# Altium footprint library LukaLIBRARY.PcbLib: 772 footprints (part 24 of 49)
Each footprint in its own frame and in the unit in brackets; x right, y up, seen from the top. Pads: shape width x height; smd on the part's side, far side on the other; paste and mask are expansions set on the pad; w line width, h text height; cw(c..) or ccw(c..) is an arc to the next point about the centre after c.
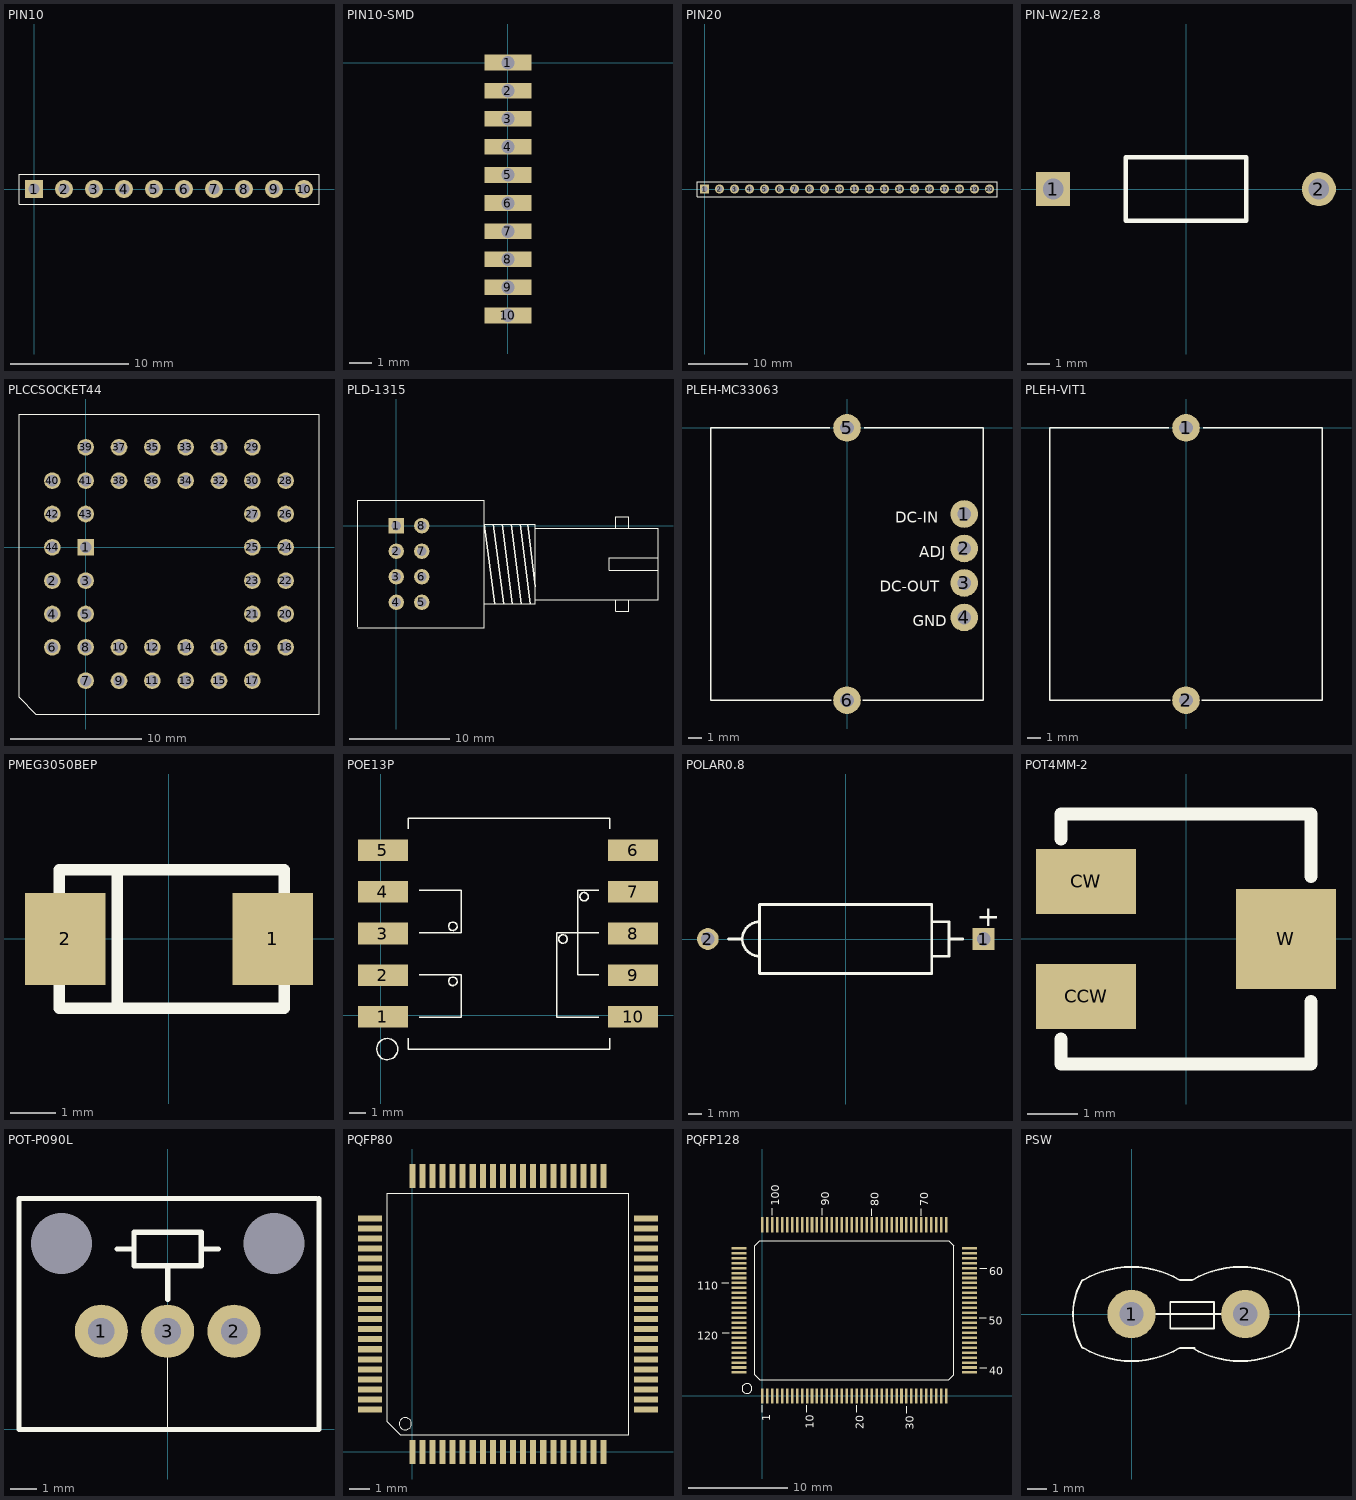
[diagram p23: the footprints below, top view; thin cyan lines are the x and y axes]

## PIN10 [mil]
pads (10):
  rect 60x60 hole 38 mask-1000: 1(0,0)
  round 60 hole 38 mask-1000: 2(100,0) 3(200,0) 4(300,0) 5(400,0) 6(500,0) 7(600,0) 8(700,0) 9(800,0) 10(900,0)
Top Overlay:
  lines w1: -50,-50 950,-50 950,50 -50,50 -50,-50
Top Solder:
  drawing of 10 lines, arcs and shapes, not listed
Bottom Solder:
  drawing of 10 lines, arcs and shapes, not listed

## PIN10-SMD [mm]
pads (10):
  rect 2.1x0.7 hole 0.6 unplated: 1(0,0) 2(0,-1.25) 3(0,-2.5) 4(0,-3.75) 5(0,-5) 6(0,-6.25) 7(0,-7.5) 8(0,-8.75) 9(0,-10) 10(0,-11.25)
Bottom Paste:
  region: -1.05,-6.6 1.05,-6.6 1.05,-5.9 -1.05,-5.9
  region: -1.05,-7.85 1.05,-7.85 1.05,-7.15 -1.05,-7.15
  region: -1.05,-9.1 1.05,-9.1 1.05,-8.4 -1.05,-8.4
  region: -1.05,-10.35 1.05,-10.35 1.05,-9.65 -1.05,-9.65
  region: -1.05,-11.6 1.05,-11.6 1.05,-10.9 -1.05,-10.9
  region: -1.05,-0.35 1.05,-0.35 1.05,0.35 -1.05,0.35
  region: -1.05,-1.6 1.05,-1.6 1.05,-0.9 -1.05,-0.9
  region: -1.05,-4.1 1.05,-4.1 1.05,-3.4 -1.05,-3.4
  region: -1.05,-2.85 1.05,-2.85 1.05,-2.15 -1.05,-2.15
  region: -1.05,-5.35 1.05,-5.35 1.05,-4.65 -1.05,-4.65
Top Solder:
  region: -1.05,-6.6 1.05,-6.6 1.05,-5.9 -1.05,-5.9
  region: -1.05,-7.85 1.05,-7.85 1.05,-7.15 -1.05,-7.15
  region: -1.05,-9.1 1.05,-9.1 1.05,-8.4 -1.05,-8.4
  region: -1.05,-10.35 1.05,-10.35 1.05,-9.65 -1.05,-9.65
  region: -1.05,-11.6 1.05,-11.6 1.05,-10.9 -1.05,-10.9
  region: -1.05,-0.35 1.05,-0.35 1.05,0.35 -1.05,0.35
  region: -1.05,-1.6 1.05,-1.6 1.05,-0.9 -1.05,-0.9
  region: -1.05,-4.1 1.05,-4.1 1.05,-3.4 -1.05,-3.4
  region: -1.05,-2.85 1.05,-2.85 1.05,-2.15 -1.05,-2.15
  region: -1.05,-5.35 1.05,-5.35 1.05,-4.65 -1.05,-4.65

## PIN20 [mil]
pads (20):
  rect 60x60 hole 38 mask-1000: 1(0,0)
  round 60 hole 38 mask-1000: 2(100,0) 3(200,0) 4(300,0) 5(400,0) 6(500,0) 7(600,0) 8(700,0) 9(800,0) 10(900,0) 11(1000,0) 12(1100,0) 13(1200,0) 14(1300,0) 15(1400,0) 16(1500,0) 17(1600,0) 18(1700,0) 19(1800,0) 20(1900,0)
Top Overlay:
  lines w1: -50,-50 950,-50 1950,-50 1950,50 950,50 -50,50 -50,-50
Top Solder:
  drawing of 20 lines, arcs and shapes, not listed
Bottom Solder:
  drawing of 20 lines, arcs and shapes, not listed

## PIN-W2/E2.8 [mm] "Thru-Hole; 2 Leads"
pads (2):
  rect 1.5x1.5 hole 0.9: 1(-5.825,0)
  round 1.5 hole 0.9: 2(5.825,0)
Top Overlay:
  lines w0.2: -2.65,-1.4 -2.65,1.4 2.65,1.4 2.65,-1.4 -2.65,-1.4

## PLCCSOCKET44 [mil]
pads (44):
  rect 50x50 hole 34 mask-1000: 1(0,0)
  round 50 hole 34 mask-1000: 2(-100,-100) 3(0,-100) 4(-100,-200) 5(0,-200) 6(-100,-300) 7(0,-400) 8(0,-300) 9(100,-400) 10(100,-300) 11(200,-400) 12(200,-300) 13(300,-400) 14(300,-300) 15(400,-400) 16(400,-300) 17(500,-400) 18(600,-300) 19(500,-300) 20(600,-200) 21(500,-200) 22(600,-100) 23(500,-100) 24(600,0) 25(500,0) 26(600,100) 27(500,100) 28(600,200) 29(500,300) 30(500,200) 31(400,300) 32(400,200) 33(300,300) 34(300,200) 35(200,300) 36(200,200) 37(100,300) 38(100,200) 39(0,300) 40(-100,200) 41(0,200) 42(-100,100) 43(0,100) 44(-100,0)
Top Overlay:
  lines w1: -200,-450 -150,-500 700,-500 700,400 -200,400 -200,-450
Top Solder:
  drawing of 44 lines, arcs and shapes, not listed
Bottom Solder:
  drawing of 44 lines, arcs and shapes, not listed

## PLD-1315 [mil]
pads (8):
  rect 60x60 hole 38: 1(0,0)
  round 60 hole 38: 2(0,-100) 3(0,-200) 4(0,-300) 5(100,-300) 6(100,-200) 7(100,-100) 8(100,0)
Top Overlay:
  lines w1: -150,-400 345,-400 345,100 -150,100 -150,-395 ; 345,-305 545,-305 545,5 345,5 ; 545,-290 1025,-290 1025,-10 545,-10 ; 860,-290 860,-335 910,-335 910,-290 ; 860,-10 860,35 910,35 910,-10 ; 1025,-175 835,-175 835,-125 1025,-125
  lines w5: 345,5 385,-305 ; 380,5 420,-305 ; 415,5 455,-305 ; 450,5 490,-305 ; 485,5 525,-305 ; 515,5 545,-240

## PLEH-MC33063 [mil]
pads (6):
  round 80 hole 40: 1(340,-250) 2(340,-350) 3(340,-450) 4(340,-550) 5(0,0) 6(0,-790)
Top Overlay:
  lines w3.94: -50,0 -395,0 -395,-790 -45,-790 ; 45,-790 395,-790 395,0 50,0
  text "ADJ" at 210,-375 h31.25
  text "DC-IN" at 140,-275 h31.25
  text "GND" at 190,-575 h31.25
  text "DC-OUT" at 95,-475 h31.25

## PLEH-VIT1 [mil]
pads (2):
  round 80 hole 40: 1(0,0) 2(0,-790)
Top Overlay:
  lines w3.94: -50,0 -395,0 -395,-790 -45,-790 ; 45,-790 395,-790 395,0 50,0

## PMEG3050BEP [mil] "Diode Schotky"
pads (2):
  rect 70x80 smd: 1(90,0) 2(-90,0)
Top Overlay:
  lines w10: -45,-55 -45,60 ; -95,-60 100,-60 100,60 -95,60 -95,-60

## POE13P [mm]
pads (10):
  rect 3x1.3 smd mask-25.4: 1(0.126,-0.102) 2(0.126,2.398) 3(0.126,4.898) 4(0.126,7.398) 5(0.126,9.898) 6(15.126,9.898) 7(15.126,7.398) 8(15.126,4.898) 9(15.126,2.398) 10(15.126,-0.102)
Top Overlay:
  circle w0.076: c4.318,5.334 r0.254
  circle w0.076: c12.192,7.112 r0.254
  circle w0.076: c10.922,4.572 r0.254
  circle w0.076: c4.318,2.032 r0.254
  circle w0.076: c0.381,-2.032 r0.635
  lines w0.076: 1.651,-1.397 1.651,-2.032 13.716,-2.032 13.716,-1.397 ; 1.651,11.176 1.651,11.811 13.716,11.811 13.716,11.176 ; 2.286,-0.127 4.826,-0.127 4.826,2.413 2.286,2.413 ; 2.286,4.953 4.826,4.953 4.826,7.493 2.286,7.493 ; 13.081,-0.127 10.541,-0.127 10.541,4.953 13.081,4.953 ; 13.081,2.413 11.811,2.413 11.811,7.493 13.081,7.493
Top Solder:
  region: -1.374,-0.752 1.626,-0.752 1.626,0.548 -1.374,0.548
  region: 13.626,-0.752 16.626,-0.752 16.626,0.548 13.626,0.548
  region: -1.374,4.248 1.626,4.248 1.626,5.548 -1.374,5.548
  region: -1.374,6.748 1.626,6.748 1.626,8.048 -1.374,8.048
  region: 13.626,6.748 16.626,6.748 16.626,8.048 13.626,8.048
  region: 13.626,4.248 16.626,4.248 16.626,5.548 13.626,5.548
  region: -1.374,1.748 1.626,1.748 1.626,3.048 -1.374,3.048
  region: 13.626,9.248 16.626,9.248 16.626,10.548 13.626,10.548
  region: 13.626,1.748 16.626,1.748 16.626,3.048 13.626,3.048
  region: -1.374,9.248 1.626,9.248 1.626,10.548 -1.374,10.548

## POLAR0.8 [mm] "Polarized Capacitor; 2 Leads"
height 5.08
pads (2):
  rect 1.6x1.6 hole 1: 1(10.16,0)
  round 1.6 hole 1: 2(-10.16,0)
Top Overlay:
  lines w0.2: -8.636,0 -7.62,0 ; -6.35,-1.27 cw(c-6.35,0) -6.35,1.27 ; 6.35,-1.27 7.62,-1.27 7.62,1.27 6.35,1.27 ; 7.62,0 8.636,0 ; -6.35,-2.54 -6.35,2.54 6.35,2.54 6.35,-2.54 -6.35,-2.54
  text "+" at 9.652,0.95 h1.5

## POT4MM-2 [mm] "Square Trimming Potentiometer"
pads (3):
  rect 2x1.3 smd: CCW(-2,-1.15) CW(-2,1.15)
  rect 2x2 smd: W(2,0)
Top Overlay:
  lines w0.254: -2.5,-2 -2.5,-2.5 2.5,-2.5 2.5,-1.25 ; -2.5,2 -2.5,2.5 2.5,2.5 2.5,1.25

## POT-P090L [mm]
pads (5):
  round 2 hole 1 mask-25.4: 1(-2.5,3.7) 2(2.5,3.7) 3(0,3.7)
  round 0 hole 2.3 mask-25.4: 4(-4,7) 5(4,7)
Top Overlay:
  lines w0.01: 0,0 0,3.7
  lines w0.2: -1.905,6.8 -1.27,6.8 ; 0,4.895 0,6.165 ; 1.27,6.8 1.905,6.8 ; 5.6,8.7 -5.6,8.7 -5.6,0 5.7,0 5.7,8.7 ; -1.27,6.165 -1.27,7.435 1.27,7.435 1.27,6.165 -1.27,6.165
Top Solder:
  region: -2.5,4.709 -2.761,4.674 -3.004,4.573 -3.213,4.413 -3.373,4.204 -3.474,3.961 -3.509,3.7 -3.474,3.439 -3.373,3.196 -3.213,2.987 -3.004,2.827 -2.761,2.726 -2.5,2.691 -2.239,2.726 -1.996,2.827 -1.787,2.987 -1.627,3.196 -1.526,3.439 -1.491,3.7 -1.526,3.961 -1.627,4.204 -1.787,4.413 -1.996,4.573 -2.239,4.674
  region: -4,8.507 -4.294,8.478 -4.577,8.393 -4.837,8.253 -5.066,8.066 -5.253,7.837 -5.393,7.577 -5.478,7.294 -5.507,7 -5.478,6.706 -5.393,6.423 -5.253,6.163 -5.066,5.934 -4.837,5.747 -4.577,5.607 -4.294,5.522 -4,5.493 -3.706,5.522 -3.423,5.607 -3.163,5.747 -2.934,5.934 -2.747,6.163 -2.607,6.423 -2.522,6.706 -2.493,7 -2.522,7.294 -2.607,7.577 -2.747,7.837 -2.934,8.066 -3.163,8.253 -3.423,8.393 -3.706,8.478
  region: 2.5,4.709 2.239,4.674 1.996,4.573 1.787,4.413 1.627,4.204 1.526,3.961 1.491,3.7 1.526,3.439 1.627,3.196 1.787,2.987 1.996,2.827 2.239,2.726 2.5,2.691 2.761,2.726 3.004,2.827 3.213,2.987 3.373,3.196 3.474,3.439 3.509,3.7 3.474,3.961 3.373,4.204 3.213,4.413 3.004,4.573 2.761,4.674
  region: 4,8.507 3.706,8.478 3.423,8.393 3.163,8.253 2.934,8.066 2.747,7.837 2.607,7.577 2.522,7.294 2.493,7 2.522,6.706 2.607,6.423 2.747,6.163 2.934,5.934 3.163,5.747 3.423,5.607 3.706,5.522 4,5.493 4.294,5.522 4.577,5.607 4.837,5.747 5.066,5.934 5.253,6.163 5.393,6.423 5.478,6.706 5.507,7 5.478,7.294 5.393,7.577 5.253,7.837 5.066,8.066 4.837,8.253 4.577,8.393 4.294,8.478
  region: 0,4.709 -0.261,4.674 -0.504,4.573 -0.713,4.413 -0.873,4.204 -0.974,3.961 -1.009,3.7 -0.974,3.439 -0.873,3.196 -0.713,2.987 -0.504,2.827 -0.261,2.726 0,2.691 0.261,2.726 0.504,2.827 0.713,2.987 0.873,3.196 0.974,3.439 1.009,3.7 0.974,3.961 0.873,4.204 0.713,4.413 0.504,4.573 0.261,4.674
Bottom Solder:
  region: -2.5,4.709 -2.761,4.674 -3.004,4.573 -3.213,4.413 -3.373,4.204 -3.474,3.961 -3.509,3.7 -3.474,3.439 -3.373,3.196 -3.213,2.987 -3.004,2.827 -2.761,2.726 -2.5,2.691 -2.239,2.726 -1.996,2.827 -1.787,2.987 -1.627,3.196 -1.526,3.439 -1.491,3.7 -1.526,3.961 -1.627,4.204 -1.787,4.413 -1.996,4.573 -2.239,4.674
  region: -4,8.507 -4.294,8.478 -4.577,8.393 -4.837,8.253 -5.066,8.066 -5.253,7.837 -5.393,7.577 -5.478,7.294 -5.507,7 -5.478,6.706 -5.393,6.423 -5.253,6.163 -5.066,5.934 -4.837,5.747 -4.577,5.607 -4.294,5.522 -4,5.493 -3.706,5.522 -3.423,5.607 -3.163,5.747 -2.934,5.934 -2.747,6.163 -2.607,6.423 -2.522,6.706 -2.493,7 -2.522,7.294 -2.607,7.577 -2.747,7.837 -2.934,8.066 -3.163,8.253 -3.423,8.393 -3.706,8.478
  region: 2.5,4.709 2.239,4.674 1.996,4.573 1.787,4.413 1.627,4.204 1.526,3.961 1.491,3.7 1.526,3.439 1.627,3.196 1.787,2.987 1.996,2.827 2.239,2.726 2.5,2.691 2.761,2.726 3.004,2.827 3.213,2.987 3.373,3.196 3.474,3.439 3.509,3.7 3.474,3.961 3.373,4.204 3.213,4.413 3.004,4.573 2.761,4.674
  region: 4,8.507 3.706,8.478 3.423,8.393 3.163,8.253 2.934,8.066 2.747,7.837 2.607,7.577 2.522,7.294 2.493,7 2.522,6.706 2.607,6.423 2.747,6.163 2.934,5.934 3.163,5.747 3.423,5.607 3.706,5.522 4,5.493 4.294,5.522 4.577,5.607 4.837,5.747 5.066,5.934 5.253,6.163 5.393,6.423 5.478,6.706 5.507,7 5.478,7.294 5.393,7.577 5.253,7.837 5.066,8.066 4.837,8.253 4.577,8.393 4.294,8.478
  region: 0,4.709 -0.261,4.674 -0.504,4.573 -0.713,4.413 -0.873,4.204 -0.974,3.961 -1.009,3.7 -0.974,3.439 -0.873,3.196 -0.713,2.987 -0.504,2.827 -0.261,2.726 0,2.691 0.261,2.726 0.504,2.827 0.713,2.987 0.873,3.196 0.974,3.439 1.009,3.7 0.974,3.961 0.873,4.204 0.713,4.413 0.504,4.573 0.261,4.674

## PQFP80 [mm]
pads (80):
  rect 0.3x1.2 smd: 1(0,0) 2(0.5,0) 3(1,0) 4(1.5,0) 5(2,0) 6(2.5,0) 7(3,0) 8(3.5,0) 9(4,0) 10(4.5,0) 11(5,0) 12(5.5,0) 13(6,0) 14(6.5,0) 15(7,0) 16(7.5,0) 17(8,0) 18(8.5,0) 19(9,0) 20(9.5,0) 41(9.5,13.7) 42(9,13.7) 43(8.5,13.7) 44(8,13.7) 45(7.5,13.7) 46(7,13.7) 47(6.5,13.7) 48(6,13.7) 49(5.5,13.7) 50(5,13.7) 51(4.5,13.7) 52(4,13.7) 53(3.5,13.7) 54(3,13.7) 55(2.5,13.7) 56(2,13.7) 57(1.5,13.7) 58(1,13.7) 59(0.5,13.7) 60(0,13.7)
  rect 1.2x0.3 smd: 21(11.6,2.1) 22(11.6,2.6) 23(11.6,3.1) 24(11.6,3.6) 25(11.6,4.1) 26(11.6,4.6) 27(11.6,5.1) 28(11.6,5.6) 29(11.6,6.1) 30(11.6,6.6) 31(11.6,7.1) 32(11.6,7.6) 33(11.6,8.1) 34(11.6,8.6) 35(11.6,9.1) 36(11.6,9.6) 37(11.6,10.1) 38(11.6,10.6) 39(11.6,11.1) 40(11.6,11.6) 61(-2.1,11.6) 62(-2.1,11.1) 63(-2.1,10.6) 64(-2.1,10.1) 65(-2.1,9.6) 66(-2.1,9.1) 67(-2.1,8.6) 68(-2.1,8.1) 69(-2.1,7.6) 70(-2.1,7.1) 71(-2.1,6.6) 72(-2.1,6.1) 73(-2.1,5.6) 74(-2.1,5.1) 75(-2.1,4.6) 76(-2.1,4.1) 77(-2.1,3.6) 78(-2.1,3.1) 79(-2.1,2.6) 80(-2.1,2.1)
Top Overlay:
  circle w0.025: c-0.35,1.4 r0.3
  lines w0.025: -1.25,1.5 -0.6,0.85 10.75,0.85 10.75,12.85 -1.25,12.85 -1.25,1.5

## PQFP128 [mil]
pads (128):
  rect 10x60 smd mask-1000: 1(0,0) 2(19.68,0) 3(39.37,0) 4(59.06,0) 5(78.74,0) 6(98.43,0) 7(118.11,0) 8(137.8,0) 9(157.48,0) 10(177.17,0) 11(196.85,0) 12(216.54,0) 13(236.22,0) 14(255.91,0) 15(275.59,0) 16(295.28,0) 17(314.96,0) 18(334.65,0) 19(354.33,0) 20(374.02,0) 21(393.7,0) 22(413.39,0) 23(433.07,0) 24(452.76,0) 25(472.44,0) 26(492.13,0) 27(511.81,0) 28(531.5,0) 29(551.18,0) 30(570.87,0) 31(590.55,0) 32(610.24,0) 33(629.92,0) 34(649.61,0) 35(669.29,0) 36(688.98,0) 37(708.66,0) 38(728.35,0) 65(728.35,677.17) 66(708.66,677.17) 67(688.98,677.17) 68(669.29,677.17) 69(649.61,677.17) 70(629.92,677.17) 71(610.24,677.17) 72(590.55,677.17) 73(570.87,677.17) 74(551.18,677.17) 75(531.5,677.17) 76(511.81,677.17) 77(492.13,677.17) 78(472.44,677.17) 79(452.76,677.17) 80(433.07,677.17) 81(413.39,677.17) 82(393.7,677.17) 83(374.02,677.17) 84(354.33,677.17) 85(334.65,677.17) 86(314.96,677.17) 87(295.28,677.17) 88(275.59,677.17) 89(255.91,677.17) 90(236.22,677.17) 91(216.54,677.17) 92(196.85,677.17) 93(177.17,677.17) 94(157.48,677.17) 95(137.8,677.17) 96(118.11,677.17) 97(98.43,677.17) 98(78.74,677.17) 99(59.06,677.17) 100(39.37,677.17) 101(19.68,677.17) 102(0,677.17)
  rect 60x10 smd mask-1000: 39(820.87,92.52) 40(820.87,112.2) 41(820.87,131.89) 42(820.87,151.57) 43(820.87,171.26) 44(820.87,190.94) 45(820.87,210.63) 46(820.87,230.31) 47(820.87,250) 48(820.87,269.69) 49(820.87,289.37) 50(820.87,309.06) 51(820.87,328.74) 52(820.87,348.43) 53(820.87,368.11) 54(820.87,387.8) 55(820.87,407.48) 56(820.87,427.17) 57(820.87,446.85) 58(820.87,466.54) 59(820.87,486.22) 60(820.87,505.91) 61(820.87,525.59) 62(820.87,545.28) 63(820.87,564.96) 64(820.87,584.65) 103(-92.52,584.65) 104(-92.52,564.96) 105(-92.52,545.28) 106(-92.52,525.59) 107(-92.52,505.91) 108(-92.52,486.22) 109(-92.52,466.54) 110(-92.52,446.85) 111(-92.52,427.17) 112(-92.52,407.48) 113(-92.52,387.8) 114(-92.52,368.11) 115(-92.52,348.43) 116(-92.52,328.74) 117(-92.52,309.06) 118(-92.52,289.37) 119(-92.52,269.69) 120(-92.52,250) 121(-92.52,230.31) 122(-92.52,210.63) 123(-92.52,190.94) 124(-92.52,171.26) 125(-92.52,151.57) 126(-92.52,131.89) 127(-92.52,112.2) 128(-92.52,92.52)
Top Overlay:
  circle w1: c-60.63,28.94 r19.69
  lines w1: -29.53,82.68 -9.84,62.99 738.19,62.99 757.87,82.68 757.87,594.49 738.19,614.17 -9.84,614.17 -29.53,594.49 -29.53,82.68
  lines w3.94: -160.04,447.64 -132.48,447.64 ; -158.07,249.8 -130.51,249.8 ; 0.39,-64.17 0.39,-36.61 ; 38.78,714.37 38.78,741.93 ; 176.57,-64.17 176.57,-36.61 ; 236.61,714.37 236.61,741.93 ; 373.43,-65.16 373.43,-37.6 ; 433.46,713.39 433.46,740.94 ; 571.26,-68.11 571.26,-40.55 ; 630.32,713.39 630.32,740.94 ; 859.65,308.86 887.2,308.86 ; 860.63,112.01 888.19,112.01 ; 860.63,505.71 888.19,505.71
  text "1" at 30.91,-101.57 h31.25
  text "100" at 66.34,751.77 h31.25
  text "10" at 204.13,-131.1 h31.25
  text "90" at 264.17,751.77 h31.25
  text "30" at 598.82,-135.04 h31.25
  text "70" at 657.87,750.79 h31.25
  text "80" at 461.02,750.79 h31.25
  text "40" at 898.03,84.45 h31.25
  text "60" at 898.03,478.15 h31.25
  text "50" at 897.05,281.3 h31.25
  text "20" at 400.98,-132.09 h31.25
  text "120" at -256.5,222.24 h31.25
  text "110" at -258.46,420.08 h31.25
Top Solder:
  drawing of 128 lines, arcs and shapes, not listed

## PSW [mil]
pads (2):
  round 100 hole 50 mask-1000: 1(0,0) 2(235,0)
Top Overlay:
  lines w3.94: -102.04,-68.94 cw(c15,0) -102.04,68.94 ; -100.1,-69.94 ccw(c0,100) 100.1,-69.94 ; -100.1,69.94 cw(c0,-100) 100.1,69.94 ; 50,0 185,0 ; 100,-70 130,-70 ; 100,70 125,70 ; 124.9,-69.94 ccw(c225,100) 325.1,-69.94 ; 124.9,69.94 cw(c225,-100) 325.1,69.94 ; 327.04,-68.94 ccw(c210,0) 327.04,68.94 ; 80,-30 170,-30 170,25 80,25 80,-30
Top Solder:
  region: 235,50.43 221.95,48.71 209.78,43.67 199.34,35.66 191.33,25.22 186.29,13.05 184.57,0 186.29,-13.05 191.33,-25.22 199.34,-35.66 209.78,-43.67 221.95,-48.71 235,-50.43 248.05,-48.71 260.22,-43.67 270.66,-35.66 278.67,-25.22 283.71,-13.05 285.43,0 283.71,13.05 278.67,25.22 270.66,35.66 260.22,43.67 248.05,48.71
  region: 0,50.43 -13.05,48.71 -25.22,43.67 -35.66,35.66 -43.67,25.22 -48.71,13.05 -50.43,0 -48.71,-13.05 -43.67,-25.22 -35.66,-35.66 -25.22,-43.67 -13.05,-48.71 0,-50.43 13.05,-48.71 25.22,-43.67 35.66,-35.66 43.67,-25.22 48.71,-13.05 50.43,0 48.71,13.05 43.67,25.22 35.66,35.66 25.22,43.67 13.05,48.71
Bottom Solder:
  region: 235,50.43 221.95,48.71 209.78,43.67 199.34,35.66 191.33,25.22 186.29,13.05 184.57,0 186.29,-13.05 191.33,-25.22 199.34,-35.66 209.78,-43.67 221.95,-48.71 235,-50.43 248.05,-48.71 260.22,-43.67 270.66,-35.66 278.67,-25.22 283.71,-13.05 285.43,0 283.71,13.05 278.67,25.22 270.66,35.66 260.22,43.67 248.05,48.71
  region: 0,50.43 -13.05,48.71 -25.22,43.67 -35.66,35.66 -43.67,25.22 -48.71,13.05 -50.43,0 -48.71,-13.05 -43.67,-25.22 -35.66,-35.66 -25.22,-43.67 -13.05,-48.71 0,-50.43 13.05,-48.71 25.22,-43.67 35.66,-35.66 43.67,-25.22 48.71,-13.05 50.43,0 48.71,13.05 43.67,25.22 35.66,35.66 25.22,43.67 13.05,48.71